# Altium footprint library FS_Footprints.PcbLib: 134 footprints (part 5 of 9)
Each footprint in its own frame and in the unit in brackets; x right, y up, seen from the top. Pads: shape width x height; smd on the part's side, far side on the other; paste and mask are expansions set on the pad; w line width, h text height; cw(c..) or ccw(c..) is an arc to the next point about the centre after c.
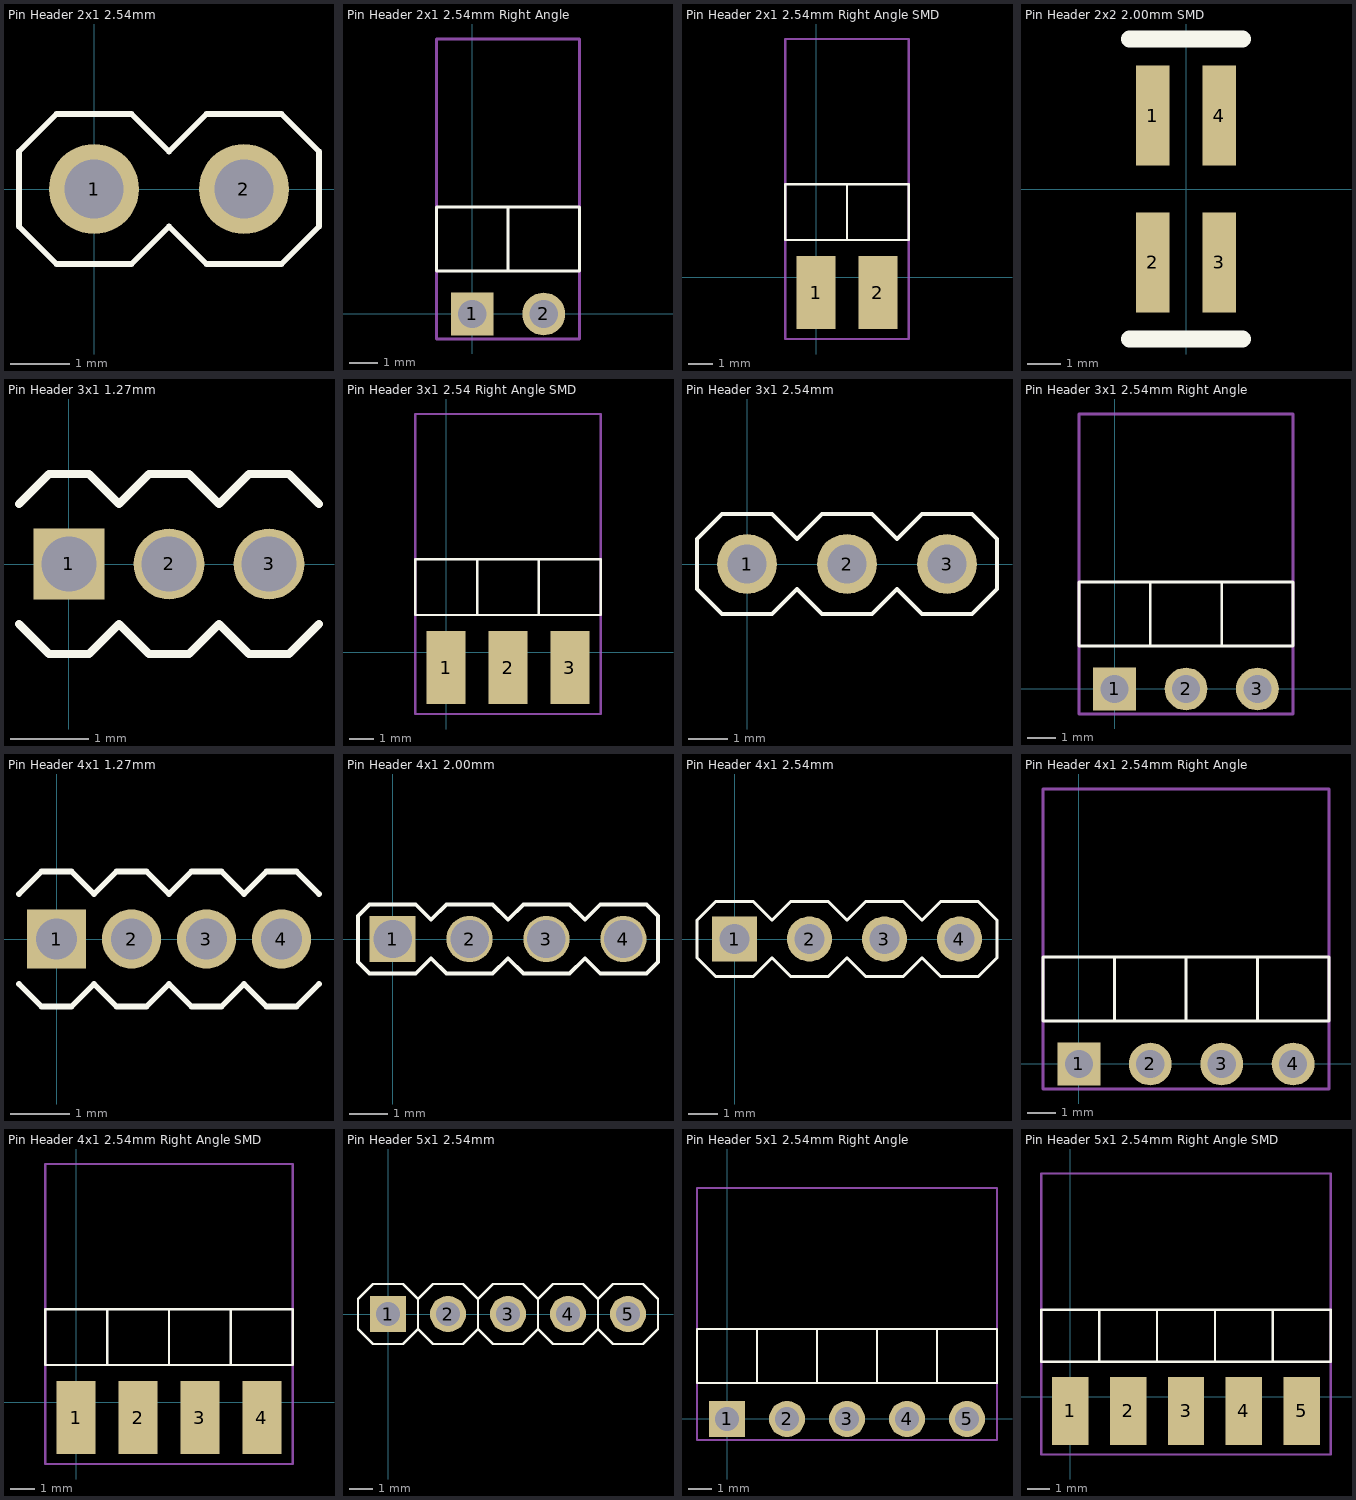
[diagram p4: the footprints below, top view; thin cyan lines are the x and y axes]

## Pin Header 2x1 2.54mm [mil]
pads (2):
  round 60 hole 39.37: 1(0,0) 2(100,0)
Top Overlay:
  lines w3.94: -50,-25 -25,-50 25,-50 50,-25 75,-50 125,-50 150,-25 150,25 125,50 75,50 50,25 25,50 -25,50 -50,25 -50,-25
3D body "User Library-Header_Male_2Pin.STEP": height 336.22, standoff -118.11, extent -49.99,-49.01 150.01,49.02

## Pin Header 2x1 2.54mm Right Angle [mil]
pads (2):
  rect 60x60 hole 39.37: 1(0,0)
  round 60 hole 39.37: 2(100,0)
Top Overlay:
  lines w3.94: 50,60 50,100 50,150 ; -50,60 150,60 150,150 -50,150 -50,60
Mechanical 15:
  lines w3.94: -50,-35 -50,385 150,385 150,60 150,-35 -50,-35
3D body "User Library-Header_Male_RA_Low_2Pin.STEP": height 99.02, standoff -118.11, extent -49.99,-12.59 150.01,386.23

## Pin Header 2x1 2.54mm Right Angle SMD [mm]
pads (2):
  rect 1.6x3 smd: 1(0,-0.635) 2(2.54,-0.635)
Top Overlay:
  lines w0.1: 1.27,1.524 1.27,2.54 1.27,3.81 ; -1.27,1.524 3.81,1.524 3.81,3.81 -1.27,3.81 -1.27,1.524
Mechanical 15:
  lines w0.1: -1.27,-2.54 -1.27,9.779 3.81,9.779 3.81,1.524 3.81,-2.54 -1.27,-2.54
3D body "User Library-Header_Male_2Pin.STEP": height 2.51, standoff 0.03, extent -1.27,-1.325 3.81,10.215

## Pin Header 2x2 2.00mm SMD [mm]
pads (4):
  rect 1x3 smd: 1(-1,2.2) 2(-1,-2.2) 3(1,-2.2) 4(1,2.2)
Top Overlay:
  lines w0.5: -1.7,-4.5 1.7,-4.5 ; -1.7,4.5 1.7,4.5
3D body "TMMH-102-01-T-DV.stp": height 5.72, standoff 0, extent -2,-3.518 2,3.518

## Pin Header 3x1 1.27mm [mm]
pads (3):
  rect 0.9x0.9 hole 0.7: 1(0,0)
  round 0.9 hole 0.7: 2(1.27,0) 3(2.54,0)
Top Overlay:
  lines w0.1: -0.635,-0.762 -0.254,-1.143 0.254,-1.143 0.635,-0.762 1.016,-1.143 1.524,-1.143 1.905,-0.762 2.286,-1.143 2.794,-1.143 3.175,-0.762 ; -0.635,0.762 -0.254,1.143 0.254,1.143 0.635,0.762 1.016,1.143 1.524,1.143 1.905,0.762 2.286,1.143 2.794,1.143 3.175,0.762
3D body: height 5.8, standoff -2.3, extent 2.34,-0.2 2.74,0.2
3D body: height 2.54, standoff 0, extent 1.905,-1.27 3.175,1.27
3D body: height 5.8, standoff -2.3, extent 1.07,-0.2 1.47,0.2
3D body: height 2.54, standoff 0, extent 0.635,-1.27 1.905,1.27
3D body: height 2.54, standoff 0, extent -0.635,-1.27 0.635,1.27
3D body: height 5.8, standoff -2.3, extent -0.2,-0.2 0.2,0.2

## Pin Header 3x1 2.54 Right Angle SMD [mm]
pads (3):
  rect 1.6x3 smd: 1(0,-0.635) 2(2.54,-0.635) 3(5.08,-0.635)
Top Overlay:
  lines w0.1: 1.27,1.524 1.27,2.54 1.27,3.81 ; 3.81,1.524 -1.27,1.524 -1.27,3.81 3.81,3.81 ; 3.81,1.524 3.81,3.81 ; 3.81,1.524 6.35,1.524 ; 3.81,3.81 6.35,3.81 ; 6.35,1.524 6.35,3.81 ; 6.35,1.524 6.35,1.524 ; 6.35,3.81 6.35,3.81
Mechanical 15:
  lines w0.1: -1.27,-2.54 -1.27,9.779 6.35,9.779 6.35,4.064 6.35,-2.54 -1.27,-2.54
3D body "User Library-Header_Male_3Pin.STEP": height 2.51, standoff 0.03, extent -1.27,-1.27 6.35,10.27

## Pin Header 3x1 2.54mm [mil]
pads (3):
  round 60 hole 39.37: 1(0,0) 2(100,0) 3(200,0)
Top Overlay:
  lines w3.94: -50,-25 -25,-50 25,-50 50,-25 75,-50 125,-50 150,-25 175,-50 225,-50 250,-25 250,25 225,50 175,50 150,25 125,50 75,50 50,25 25,50 -25,50 -50,25 -50,-25
3D body "User Library-Header_Male_3Pin.STEP": height 336.22, standoff -118.11, extent -49.99,-49.01 250.01,49.02

## Pin Header 3x1 2.54mm Right Angle [mil]
pads (3):
  rect 60x60 hole 39.37: 1(0,0)
  round 60 hole 39.37: 2(100,0) 3(200,0)
Top Overlay:
  lines w3.94: 50,60 50,100 50,150 ; 150,60 -50,60 -50,150 150,150 ; 150,60 150,150 ; 150,60 250,60 ; 150,150 250,150 ; 250,60 250,149.99 ; 250,60 250,60 ; 250,150 250,149.99
Mechanical 15:
  lines w3.94: -50,-35 -50,385 250,385 250,160 250,-35 -50,-35
3D body "User Library-Header_Male_RA_Low_3Pin.STEP": height 99.02, standoff -118.11, extent -49.99,-12.59 250.01,386.23

## Pin Header 4x1 1.27mm [mm]
pads (4):
  rect 1x1 hole 0.7: 1(0,0)
  round 1 hole 0.7: 2(1.27,0) 3(2.54,0) 4(3.81,0)
Top Overlay:
  lines w0.1: -0.635,-0.762 -0.254,-1.143 0.254,-1.143 0.635,-0.762 1.016,-1.143 1.524,-1.143 1.905,-0.762 2.286,-1.143 2.794,-1.143 3.175,-0.762 3.556,-1.143 4.064,-1.143 4.445,-0.762 ; -0.635,0.762 -0.254,1.143 0.254,1.143 0.635,0.762 1.016,1.143 1.524,1.143 1.905,0.762 2.286,1.143 2.794,1.143 3.175,0.762 3.556,1.143 4.064,1.143 4.445,0.762
3D body: height 5.8, standoff -2.3, extent 3.61,-0.2 4.01,0.2
3D body: height 2.54, standoff 0, extent 3.175,-1.27 4.445,1.27
3D body: height 5.8, standoff -2.3, extent 2.34,-0.2 2.74,0.2
3D body: height 2.54, standoff 0, extent 1.905,-1.27 3.175,1.27
3D body: height 5.8, standoff -2.3, extent 1.07,-0.2 1.47,0.2
3D body: height 2.54, standoff 0, extent 0.635,-1.27 1.905,1.27
3D body: height 2.54, standoff 0, extent -0.635,-1.27 0.635,1.27
3D body: height 5.8, standoff -2.3, extent -0.2,-0.2 0.2,0.2

## Pin Header 4x1 2.00mm [mm]
pads (4):
  rect 1.2x1.2 hole 1: 1(0,0)
  round 1.2 hole 1: 2(2,0) 3(4,0) 4(6,0)
Top Overlay:
  lines w0.1: -0.9,-0.6 -0.9,0.6 -0.6,0.9 0.6,0.9 1,0.5 1.4,0.9 2.6,0.9 3,0.5 3.4,0.9 4.6,0.9 5,0.5 5.4,0.9 6.6,0.9 6.9,0.6 6.9,-0.6 6.6,-0.9 5.4,-0.9 5,-0.5 4.6,-0.9 3.4,-0.9 3,-0.5 2.6,-0.9 1.4,-0.9 1,-0.5 0.6,-0.9 -0.6,-0.9 -0.9,-0.6
3D body: height 2, standoff 0, extent 5,-1 7,1
3D body: height 5.7, standoff -2.8, extent 5.75,-0.25 6.25,0.25
3D body: height 2, standoff 0, extent 3,-1 5,1
3D body: height 5.7, standoff -2.8, extent 3.75,-0.25 4.25,0.25
3D body: height 2, standoff 0, extent 1,-1 3,1
3D body: height 5.7, standoff -2.8, extent 1.75,-0.25 2.25,0.25
3D body: height 5.7, standoff -2.8, extent -0.25,-0.25 0.25,0.25
3D body: height 2, standoff 0, extent -1,-1 1,1

## Pin Header 4x1 2.54mm [mil]
pads (4):
  rect 60x60 hole 39.37: 1(0,0)
  round 60 hole 39.37: 2(100,0) 3(200,0) 4(300,0)
Top Overlay:
  lines w3.94: -50,-25 -25,-50 25,-50 50,-25 75,-50 125,-50 150,-25 175,-50 225,-50 250,-25 275,-50 325,-50 350,-25 350,25 325,50 275,50 250,25 225,50 175,50 150,25 125,50 75,50 50,25 25,50 -25,50 -50,25 -50,-25
3D body "User Library-Header_Male_4Pin.STEP": height 336.22, standoff -118.11, extent -49.99,-49.01 350.01,49.02

## Pin Header 4x1 2.54mm Right Angle [mil]
pads (4):
  rect 60x60 hole 39.37: 1(0,0)
  round 60 hole 39.37: 2(100,0) 3(200,0) 4(300,0)
Top Overlay:
  lines w3.94: 50,60 50,100 50,150 ; 150,60 250,60 ; 150,60 150,150 ; 150,60 -50,60 -50,150 150,150 ; 150,150 250,150 ; 250,60 250,60 ; 250,60 250,149.99 ; 250,60 350,60 ; 250,150 250,149.99 ; 250,149.99 349.99,149.99 ; 350,60 350,60 ; 350,60 350,150 ; 349.99,149.99 350,150
Mechanical 15:
  lines w3.94: -50,-35 350,-35 350,260 350,385 -50,385 -50,-35
3D body "User Library-Header_Male_RA_Low_4Pin.STEP": height 99.02, standoff -118.11, extent -49.99,-12.59 350.01,386.23

## Pin Header 4x1 2.54mm Right Angle SMD [mm]
pads (4):
  rect 1.6x3 smd: 1(0,-0.635) 2(2.54,-0.635) 3(5.08,-0.635) 4(7.62,-0.635)
Top Overlay:
  lines w0.1: 1.27,1.524 1.27,2.54 1.27,3.81 ; 3.81,1.524 6.35,1.524 ; 3.81,1.524 3.81,3.81 ; 3.81,1.524 -1.27,1.524 -1.27,3.81 3.81,3.81 ; 3.81,3.81 6.35,3.81 ; 6.35,1.524 8.89,1.524 8.89,3.81 6.35,3.81 ; 6.35,1.524 6.35,1.524 ; 6.35,1.524 6.35,3.81 ; 6.35,3.81 6.35,3.81
Mechanical 15:
  lines w0.1: -1.27,-2.54 8.89,-2.54 8.89,6.604 8.89,9.779 -1.27,9.779 -1.27,-2.54
3D body "User Library-Header_Male_4Pin.STEP": height 2.51, standoff 0.03, extent -1.27,-1.27 8.89,10.27

## Pin Header 5x1 2.54mm [mil]
pads (5):
  rect 60x60 hole 39.37: 1(0,0)
  round 60 hole 39.37: 2(100,0) 3(200,0) 4(300,0) 5(400,0)
Top Overlay:
  lines w3.94: 50,-25 50,25 ; 50,-25 25,-50 -25,-50 -50,-25 -50,25 -25,50 25,50 50,25 ; 50,-25 75,-50 125,-50 150,-25 ; 50,25 75,50 125,50 150,25 ; 150,-25 175,-50 225,-50 250,-25 ; 150,-25 150,25 ; 150,25 175,50 225,50 250,25 ; 250,-25 275,-50 325,-50 350,-25 ; 250,-25 250,25 ; 250,25 275,50 325,50 350,25 ; 350,-25 375,-50 425,-50 450,-25 450,25 425,50 375,50 350,25 ; 350,-25 350,25
3D body "User Library-Header_Male_5Pin.STEP": height 336.22, standoff -118.11, extent -50,-49.01 450,49.02

## Pin Header 5x1 2.54mm Right Angle [mil]
pads (5):
  rect 60x60 hole 39.37: 1(0,0)
  round 60 hole 39.37: 2(100,0) 3(200,0) 4(300,0) 5(400,0)
Top Overlay:
  lines w3.94: 50,60 50,100 50,150 ; 150,60 -50,60 -50,150 150,150 ; 150,60 150,150 ; 150,60 250,60 ; 150,150 250,150 ; 250,60 350,60 ; 250,60 250,149.99 ; 250,60 250,60 ; 250,149.99 349.99,149.99 ; 250,150 250,149.99 ; 350,60 450,60 ; 350,60 350,150 ; 350,60 350,60 ; 350,150 450,150 450,60 ; 349.99,149.99 350,150 ; 450,60 450,60
Mechanical 15:
  lines w3.94: -50,-35 -50,385 450,385 450,360 450,-35 -50,-35
3D body "User Library-Header_Male_RA_Low_5Pin.STEP": height 99.02, standoff -118.11, extent -49.99,-12.59 450.01,386.23

## Pin Header 5x1 2.54mm Right Angle SMD [mm]
pads (5):
  rect 1.6x3 smd: 1(0,-0.635) 2(2.54,-0.635) 3(5.08,-0.635) 4(7.62,-0.635) 5(10.16,-0.635)
Top Overlay:
  lines w0.1: 1.27,1.524 1.27,2.54 1.27,3.81 ; 3.81,1.524 -1.27,1.524 -1.27,3.81 3.81,3.81 ; 3.81,1.524 3.81,3.81 ; 3.81,1.524 6.35,1.524 ; 3.81,3.81 6.35,3.81 ; 6.35,1.524 6.35,3.81 ; 6.35,1.524 6.35,1.524 ; 6.35,1.524 8.89,1.524 ; 6.35,3.81 6.35,3.81 ; 6.35,3.81 8.89,3.81 ; 8.89,1.524 8.89,3.81 ; 8.89,1.524 11.43,1.524 11.43,3.81 8.89,3.81
Mechanical 15:
  lines w0.1: -1.27,-2.54 -1.27,9.779 11.43,9.779 11.43,4.064 11.43,-2.54 -1.27,-2.54
3D body "User Library-Header_Male_5Pin.STEP": height 2.51, standoff 0.03, extent -1.27,-1.27 11.43,10.27